# Altium footprint library PcbLib1.PcbLib: 212 footprints (part 13 of 14)
Each footprint in its own frame and in the unit in brackets; x right, y up, seen from the top. Pads: shape width x height; smd on the part's side, far side on the other; paste and mask are expansions set on the pad; w line width, h text height; cw(c..) or ccw(c..) is an arc to the next point about the centre after c.
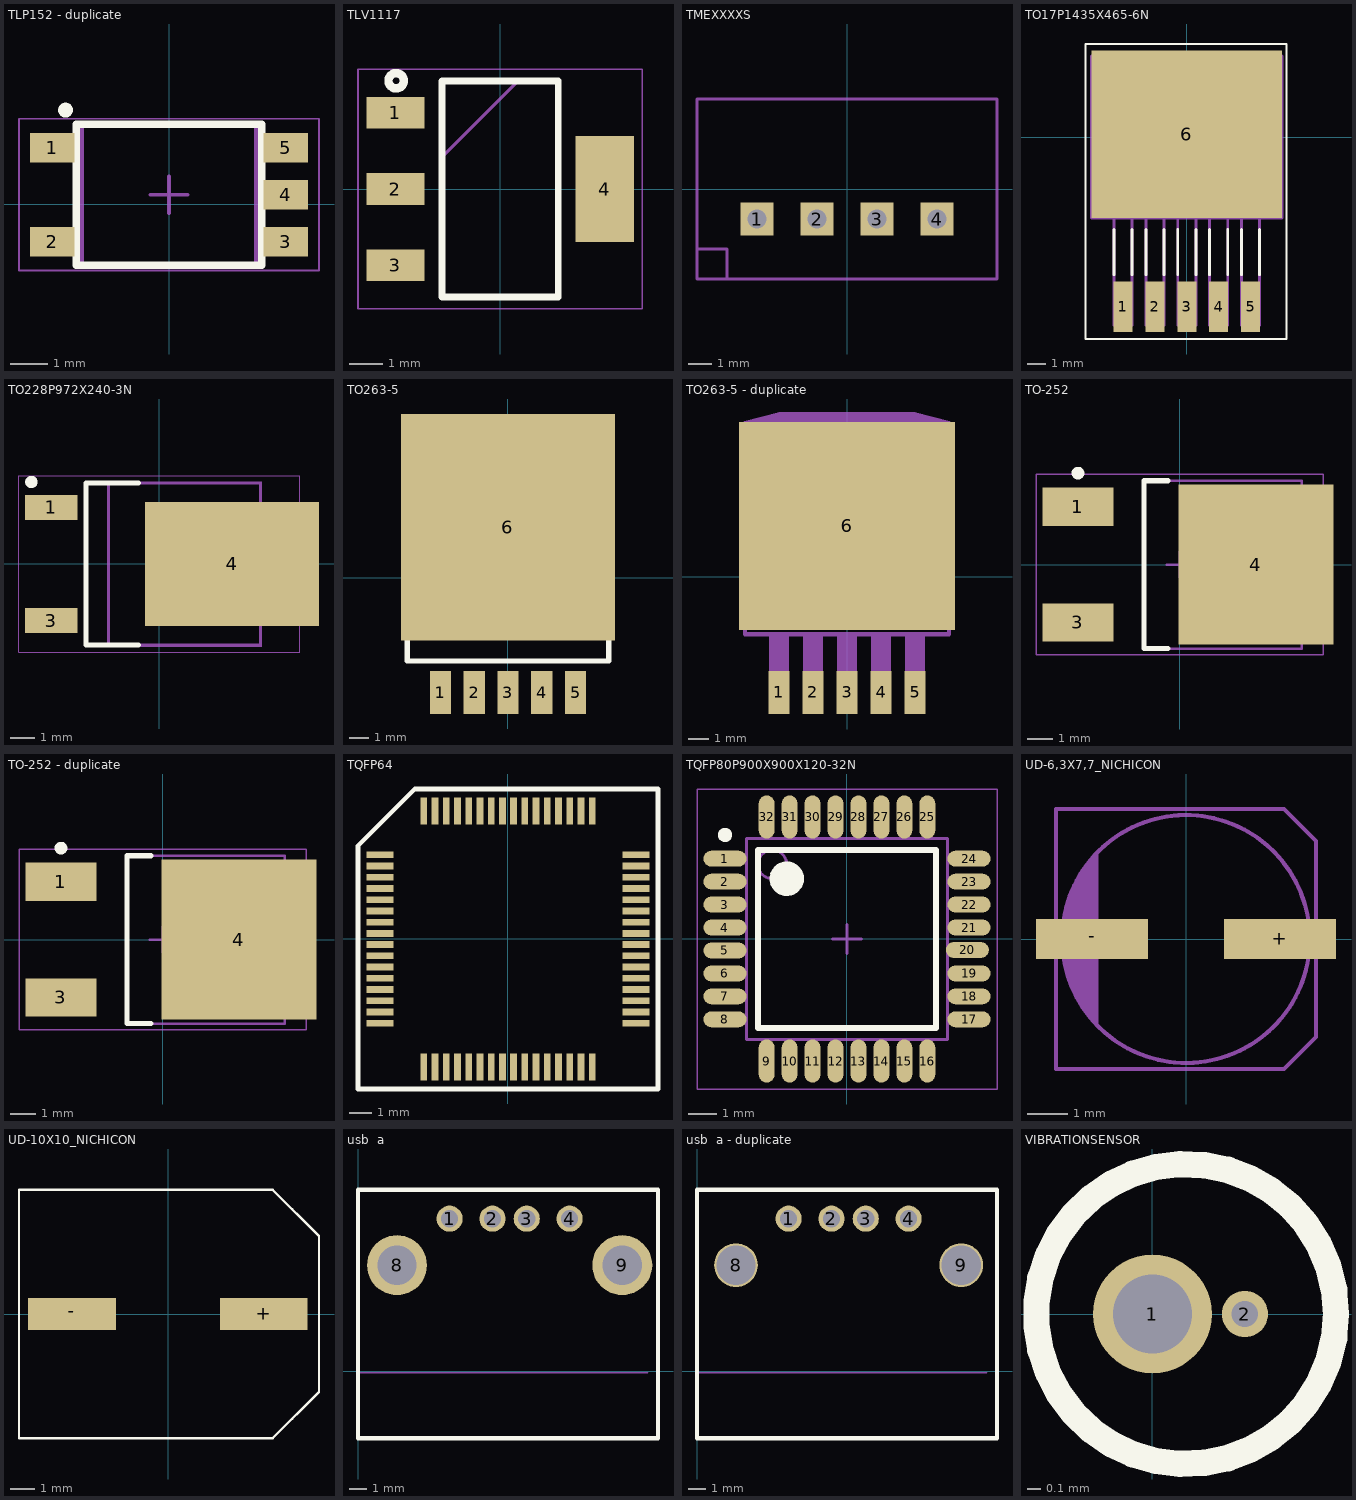
[diagram p12: the footprints below, top view; thin cyan lines are the x and y axes]

## TLP152 - duplicate [mm] "SOTFL, 5-Leads, Body 3.75x7.20mm, Pitch 1.27mm, IPC Medium Density"
height 2.2
pads (5):
  rect 1.2x0.8 smd: 1(-3.15,1.524) 2(-3.15,-1.016) 3(3.15,-1.016) 4(3.15,0.254) 5(3.15,1.524)
Top Overlay:
  lines w0.2: -2.5,-1.646 2.5,-1.646 2.5,2.154 -2.5,2.154 -2.5,-1.646
  lines w0.25: -2.72,2.538 cw(c-2.794,2.54) -2.72,2.547
Top Courtyard:
  lines w0.05: -4.05,-1.796 -4.05,2.304 4.05,2.304 4.05,-1.796 -4.05,-1.796
  lines w0.1: -0.5,0.254 0.5,0.254 ; 0,-0.246 0,0.754
Top Assembly:
  lines w0.1: -2.35,-1.646 -2.35,2.154 2.35,2.154 2.35,-1.646 -2.35,-1.646
3D body "User Library-TLP-152-1.STEP": height 2.11, standoff 0.01, extent -3.393,-1.651 3.383,2.149

## TLV1117 [mm]
pads (4):
  rect 1.75x0.95 smd: 1(-3.15,2.3) 2(-3.15,0) 3(-3.15,-2.3)
  rect 1.75x3.2 smd: 4(3.15,0)
Top Overlay:
  circle w0.254: c-3.127,3.256 r0.231
  lines w0.2: -1.75,-3.25 1.75,-3.25 1.75,3.25 -1.75,3.25 -1.75,-3.25
Mechanical 13:
  lines w0.1: -1.75,0.95 0.55,3.25 ; -1.75,-3.25 1.75,-3.25 1.75,3.25 -1.75,3.25 -1.75,-3.25
Mechanical 15:
  lines w0.05: -4.275,-3.6 4.275,-3.6 4.275,3.6 -4.275,3.6 -4.275,-3.6
3D body "TLV1117-33IDCYR.stp": height 1.8, standoff 0, extent -3.5,-3.25 3.5,3.25

## TMEXXXXS [mil] "TMEXXXXS"
pads (4):
  rect 55x55 / inner round 0 / far side rect 55x55 hole 32: 1(-150,-50) 2(-50,-50) 3(50,-50) 4(150,-50)
Bottom 3D Body:
  lines w5: -250,-100 -200,-100 -200,-150 ; -250,-100 -250,150 250,150 250,-150 -200,-150 ; -250,-100 -250,-150 -200,-150
  text "A+" at 100,0 h77.5
  text "A-" at 0,0 h77.5
  text "E+" at -100,0 h77.5
  text "E-" at -200,0 h77.5
3D body: height 50, standoff 0, extent 124.1,-75.9 175.9,-24.1
3D body: height 50, standoff 0, extent 24.1,-75.9 75.9,-24.1
3D body: height 50, standoff 0, extent -75.9,-75.9 -24.1,-24.1
3D body: height 50, standoff 0, extent -175.9,-75.9 -124.1,-24.1

## TO17P1435X465-6N [mil]
pads (6):
  rect 40x106 smd: 1(-134,-356) 2(-67,-356) 3(0,-356) 4(67,-356) 5(134,-356)
  rect 400x352 smd: 6(0,6)
Top Overlay:
  lines w3.94: -212.47,-423.79 209.17,-423.79 209.17,195.52 -212.47,195.52 -212.47,-423.79
  lines w6: -153,-289 -153,-194 ; -115,-289 -115,-194 ; -86,-289 -86,-194 ; -48,-289 -48,-194 ; -19,-289 -19,-194 ; 19,-289 19,-194 ; 48,-289 48,-194 ; 86,-289 86,-194 ; 115,-289 115,-194 ; 153,-289 153,-194
Mechanical 13:
  lines w6: -200,-170 -200,170 200,170 200,-170 -200,-170 ; -153,-395 -115,-395 -115,-170 -153,-170 -153,-395 ; -86,-395 -48,-395 -48,-170 -86,-170 -86,-395 ; -19,-395 19,-395 19,-170 -19,-170 -19,-395 ; 48,-395 86,-395 86,-170 48,-170 48,-395 ; 115,-395 153,-395 153,-170 115,-170 115,-395
3D body "LM2596SX-12--3DModel-STEP-56544.STEP": height 183.5, standoff -5.5, extent -200.98,-391.77 199.02,173.23

## TO228P972X240-3N [mm]
pads (3):
  rect 2.1x1 smd: 1(-4.35,2.28) 3(-4.35,-2.28)
  rect 7x5 smd: 4(2.921,0)
Top Overlay:
  circle w0.25: c-5.15,3.3 r0.125
  lines w0.2: -0.85,-3.25 -2.95,-3.25 -2.95,3.25 -0.85,3.25
Mechanical 13:
  lines w0.1: 4.062,-2.35 4.326,-2.35 4.863,-1.756 4.863,1.756 4.327,2.35 4.063,2.35 ; -2.037,-3.25 -2.037,3.25 4.062,3.25 4.062,-3.25 -2.037,-3.25
Mechanical 15:
  circle w0.05: c0,0 r0.35
  lines w0.001: -2.088,-3.3 -2.088,3.3 4.112,3.3 4.112,-3.3 -2.088,-3.3
  lines w0.05: -0.5,0 0.5,0 ; 0,-0.5 0,0.5 ; -5.65,-3.55 -5.65,3.55 5.65,3.55 5.65,-3.55 -5.65,-3.55
3D body "TO-252AA-IRF.stp": height 2.4, standoff 0.01, extent -4.826,-3.356 5.588,3.356

## TO263-5 [mil] "TO263-5"
pads (6):
  rect 42x85 smd: 1(-134,-228) 2(-67,-228) 3(0,-228) 4(67,-228) 5(134,-228)
  rect 425.2x450 smd: 6(0,100)
Top Overlay:
  lines w10: -200,-110 -200,-165 200,-165 200,-110
Bottom Assembly:
  lines w8: -200.98,302.28 -200.98,286.1 200.98,286.1 200.98,302.28 ; -200.55,282.09 200.55,282.09
3D body "TO263-5-1.stp": height 166.46, standoff -3.46, extent -196.67,-263 190,313

## TO263-5 - duplicate [mil] "TO263-5"
pads (6):
  rect 42x85 smd: 1(-134,-228) 2(-67,-228) 3(0,-228) 4(67,-228) 5(134,-228)
  rect 425.2x409.84 smd: 6(0,100)
Bottom Assembly:
  region: -201,286.1 -201,302.29 -133,320.29 133,320.29 201,302.29 201,286.1
  region: 115,-260 115,-175 153,-175 153,-260
  region: 48,-260 48,-175 86,-175 86,-260
  region: -19,-260 -19,-175 19,-175 19,-260
  region: -86,-260 -86,-175 -48,-175 -48,-260
  region: -153,-260 -153,-175 -115,-175 -115,-260
  lines w8: -200.55,-113.39 -200.55,282.09 200.55,282.09 200.55,-113.39 ; -200.98,286.1 200.98,286.1 200.98,302.28 132.99,320.28 -132.99,320.28 -200.98,302.28 -200.98,286.1
Bottom 3D Body:
  region: 115,-176 115,-110 153,-110 153,-176
  region: 48,-176 48,-110 86,-110 86,-176
  region: -19,-176 -19,-110 19,-110 19,-176
  region: -86,-176 -86,-110 -48,-110 -48,-176
  region: -153,-176 -153,-110 -115,-110 -115,-176
  lines w8: -200.55,-113.39 200.55,-113.39

## TO-252 [mm]
height 2.4
pads (3):
  rect 2.8x1.5 smd: 1(-4,2.275) 3(-4,-2.275)
  rect 6.1x6.3 smd: 4(3,0)
Top Overlay:
  circle w0.25: c-4,3.6 r0.125
  lines w0.2: -0.45,-3.3 -1.4,-3.3 -1.4,3.3 -0.45,3.3
Top Courtyard:
  lines w0.05: -5.65,-3.55 -5.65,3.55 5.65,3.55 5.65,-3.55 -5.65,-3.55
  lines w0.1: -0.5,0 0.5,0 ; 0,-0.5 0,0.5
Top Assembly:
  lines w0.1: -1.4,-3.3 -1.4,3.3 4.8,3.3 4.8,-3.3 -1.4,-3.3
3D body "User Library-DPAK_TO-252AA.step": height 2.41, standoff 0.01, extent -4.523,-3.367 5.577,3.367

## TO-252 - duplicate [mm]
height 2.4
pads (3):
  rect 2.8x1.5 smd: 1(-4,2.275) 3(-4,-2.275)
  rect 6.1x6.3 smd: 4(3,0)
Top Overlay:
  circle w0.25: c-4,3.6 r0.125
  lines w0.2: -0.45,-3.3 -1.4,-3.3 -1.4,3.3 -0.45,3.3
Top Courtyard:
  lines w0.05: -5.65,-3.55 5.65,-3.55 5.65,3.55 -5.65,3.55 -5.65,-3.55
  lines w0.1: -0.5,0 0.5,0 ; 0,-0.5 0,0.5
Top Assembly:
  lines w0.1: -1.4,-3.3 4.8,-3.3 4.8,3.3 -1.4,3.3 -1.4,-3.3
3D body "User Library-DPAK_TO-252AA.step": height 2.41, standoff 0.01, extent -4.523,-3.367 5.577,3.367

## TQFP64 [mm] "TQFP64"
pads (64):
  rect 1.2x0.3 smd: 1(-5.7,3.75) 2(-5.7,3.25) 3(-5.7,2.75) 4(-5.7,2.25) 5(-5.7,1.75) 6(-5.7,1.25) 7(-5.7,0.75) 8(-5.7,0.25) 9(-5.7,-0.25) 10(-5.7,-0.75) 11(-5.7,-1.25) 12(-5.7,-1.75) 13(-5.7,-2.25) 14(-5.7,-2.75) 15(-5.7,-3.25) 16(-5.7,-3.75) 33(5.7,-3.75) 34(5.7,-3.25) 35(5.7,-2.75) 36(5.7,-2.25) 37(5.7,-1.75) 38(5.7,-1.25) 39(5.7,-0.75) 40(5.7,-0.25) 41(5.7,0.25) 42(5.7,0.75) 43(5.7,1.25) 44(5.7,1.75) 45(5.7,2.25) 46(5.7,2.75) 47(5.7,3.25) 48(5.7,3.75)
  rect 0.3x1.2 smd: 17(-3.75,-5.7) 18(-3.25,-5.7) 19(-2.75,-5.7) 20(-2.25,-5.7) 21(-1.75,-5.7) 22(-1.25,-5.7) 23(-0.75,-5.7) 24(-0.25,-5.7) 25(0.25,-5.7) 26(0.75,-5.7) 27(1.25,-5.7) 28(1.75,-5.7) 29(2.25,-5.7) 30(2.75,-5.7) 31(3.25,-5.7) 32(3.75,-5.7) 49(3.75,5.7) 50(3.25,5.7) 51(2.75,5.7) 52(2.25,5.7) 53(1.75,5.7) 54(1.25,5.7) 55(0.75,5.7) 56(0.25,5.7) 57(-0.25,5.7) 58(-0.75,5.7) 59(-1.25,5.7) 60(-1.75,5.7) 61(-2.25,5.7) 62(-2.75,5.7) 63(-3.25,5.7) 64(-3.75,5.7)
Top Overlay:
  lines w0.203: -6.675,-6.675 -6.675,4.15 -4.15,6.675 6.675,6.675 6.675,-6.675 -6.675,-6.675

## TQFP80P900X900X120-32N [mm] "TQFP, 32-Leads, Body 7.00x7.00mm, Pitch 0.80mm, IPC Medium Density"
height 1.2
pads (32):
  oval 1.5x0.55 smd: 1(-4.25,2.8) 2(-4.25,2) 3(-4.25,1.2) 4(-4.25,0.4) 5(-4.25,-0.4) 6(-4.25,-1.2) 7(-4.25,-2) 8(-4.25,-2.8) 17(4.25,-2.8) 18(4.25,-2) 19(4.25,-1.2) 20(4.191,-0.381) 21(4.25,0.4) 22(4.25,1.2) 23(4.25,2) 24(4.25,2.8)
  oval 0.55x1.5 smd: 9(-2.8,-4.25) 10(-2,-4.25) 11(-1.2,-4.25) 12(-0.4,-4.25) 13(0.4,-4.25) 14(1.2,-4.25) 15(2,-4.25) 16(2.8,-4.25) 25(2.8,4.25) 26(2,4.25) 27(1.2,4.25) 28(0.4,4.25) 29(-0.4,4.25) 30(-1.2,4.25) 31(-2,4.25) 32(-2.8,4.25)
Top Overlay:
  circle w0.25: c-4.25,3.625 r0.125
  circle w0.6: c-2.1,2.1 r0.3
  lines w0.2: -3.1,-3.1 -3.1,3.1 3.1,3.1 3.1,-3.1 -3.1,-3.1
Mechanical 13:
  circle w0.1: c-2.6,2.6 r0.5
  lines w0.1: -3.5,-3.5 -3.5,3.5 3.5,3.5 3.5,-3.5 -3.5,-3.5
Mechanical 15:
  lines w0.05: -5.225,-5.225 -5.225,5.225 5.225,5.225 5.225,-5.225 -5.225,-5.225
  lines w0.1: -0.5,0 0.5,0 ; 0,-0.5 0,0.5
3D body "User Library-QFP32.STEP": height 1.6, standoff -0.05, extent -4.445,-4.5 4.555,4.5

## UD-6,3X7,7_NICHICON [mm] "UD-6,3X7,7_NICHICON"
pads (2):
  rect 2.8x1 smd: +(2.35,0) -(-2.35,0)
Bottom Assembly:
  circle w0.102: c0,0 r3.1
  region: -2.2,2.15 -2.339,2.008 -2.577,1.69 -2.773,1.345 -2.923,0.977 -3.024,0.593 -3.075,0.199 -3.075,-0.199 -3.024,-0.593 -2.923,-0.977 -2.773,-1.345 -2.577,-1.69 -2.339,-2.008 -2.2,-2.15
  lines w0.102: -3.25,-3.25 2.45,-3.25 3.25,-2.45 3.25,2.45 2.45,3.25 -3.25,3.25 -3.25,-3.25
Bottom 3D Body:
  lines w0.102: -3.25,-0.7 -3.25,-3.25 2.45,-3.25 3.25,-2.45 ; -3.25,0.8 -3.25,3.25 2.45,3.25 3.25,2.45 ; -3,0.775 cw(c-0.002,0.005) 2.975,0.85 ; -2.975,-0.85 ccw(c0.002,-0.005) 3,-0.775

## UD-10X10_NICHICON [mm] "UD-10X10_NICHICON"
pads (2):
  rect 3.6x1.3 smd: +(3.925,0) -(-3.95,0)
Top Overlay:
  lines w0.102: -5.1,-5.1 4.3,-5.1 ; -5.1,5.1 4.3,5.1 ; 5.1,-4.3 4.3,-5.1 ; 5.1,4.3 4.3,5.1 ; 4.3,-5.1 6.2,-3.2 6.2,3.2 4.3,5.1 ; 4.3,-5.1 -6.125,-5.1 -6.125,5.1 4.3,5.1

## usb  a [mm]
pads (6):
  round 1.524 hole 1: 1(5.345,8.91) 2(7.845,8.91) 3(9.845,8.91) 4(12.345,8.91)
  round 3.5 hole 2.3: 8(2.275,6.2) 9(15.415,6.2)
Top Overlay:
  lines w0.254: 0,-3.9 17.5,-3.9 17.5,10.6 0,10.6 0,-3.9
Mechanical 15:
  lines w0.1: 0,9.9 0,-0.075 16.906,-0.075
3D body "1-292303-3.stp": height 7.39, standoff -3.98, extent 0.647,-4.221 16.879,9.779

## usb  a - duplicate [mm]
pads (6):
  round 1.524 hole 1: 1(5.345,8.91) 2(7.845,8.91) 3(9.845,8.91) 4(12.345,8.91)
  round 2.55 hole 2.3: 8(2.275,6.2) 9(15.415,6.2)
Top Overlay:
  lines w0.254: 0,-3.9 17.5,-3.9 17.5,10.6 0,10.6 0,-3.9
Mechanical 15:
  lines w0.1: 0,9.9 0,-0.075 16.906,-0.075

## VIBRATIONSENSOR [mm]
pads (2):
  round 0.9 hole 0.6: 1(0,0)
  round 0.35 hole 0.2: 2(0.7,0)
Top Overlay:
  circle w0.2: c0.254,0 r1.136